# Altium footprint library connectors_socets.pcblib: 601 footprints (part 7 of 38)
Each footprint in its own frame and in the unit in brackets; x right, y up, seen from the top. Pads: shape width x height; smd on the part's side, far side on the other; paste and mask are expansions set on the pad; w line width, h text height; cw(c..) or ccw(c..) is an arc to the next point about the centre after c.
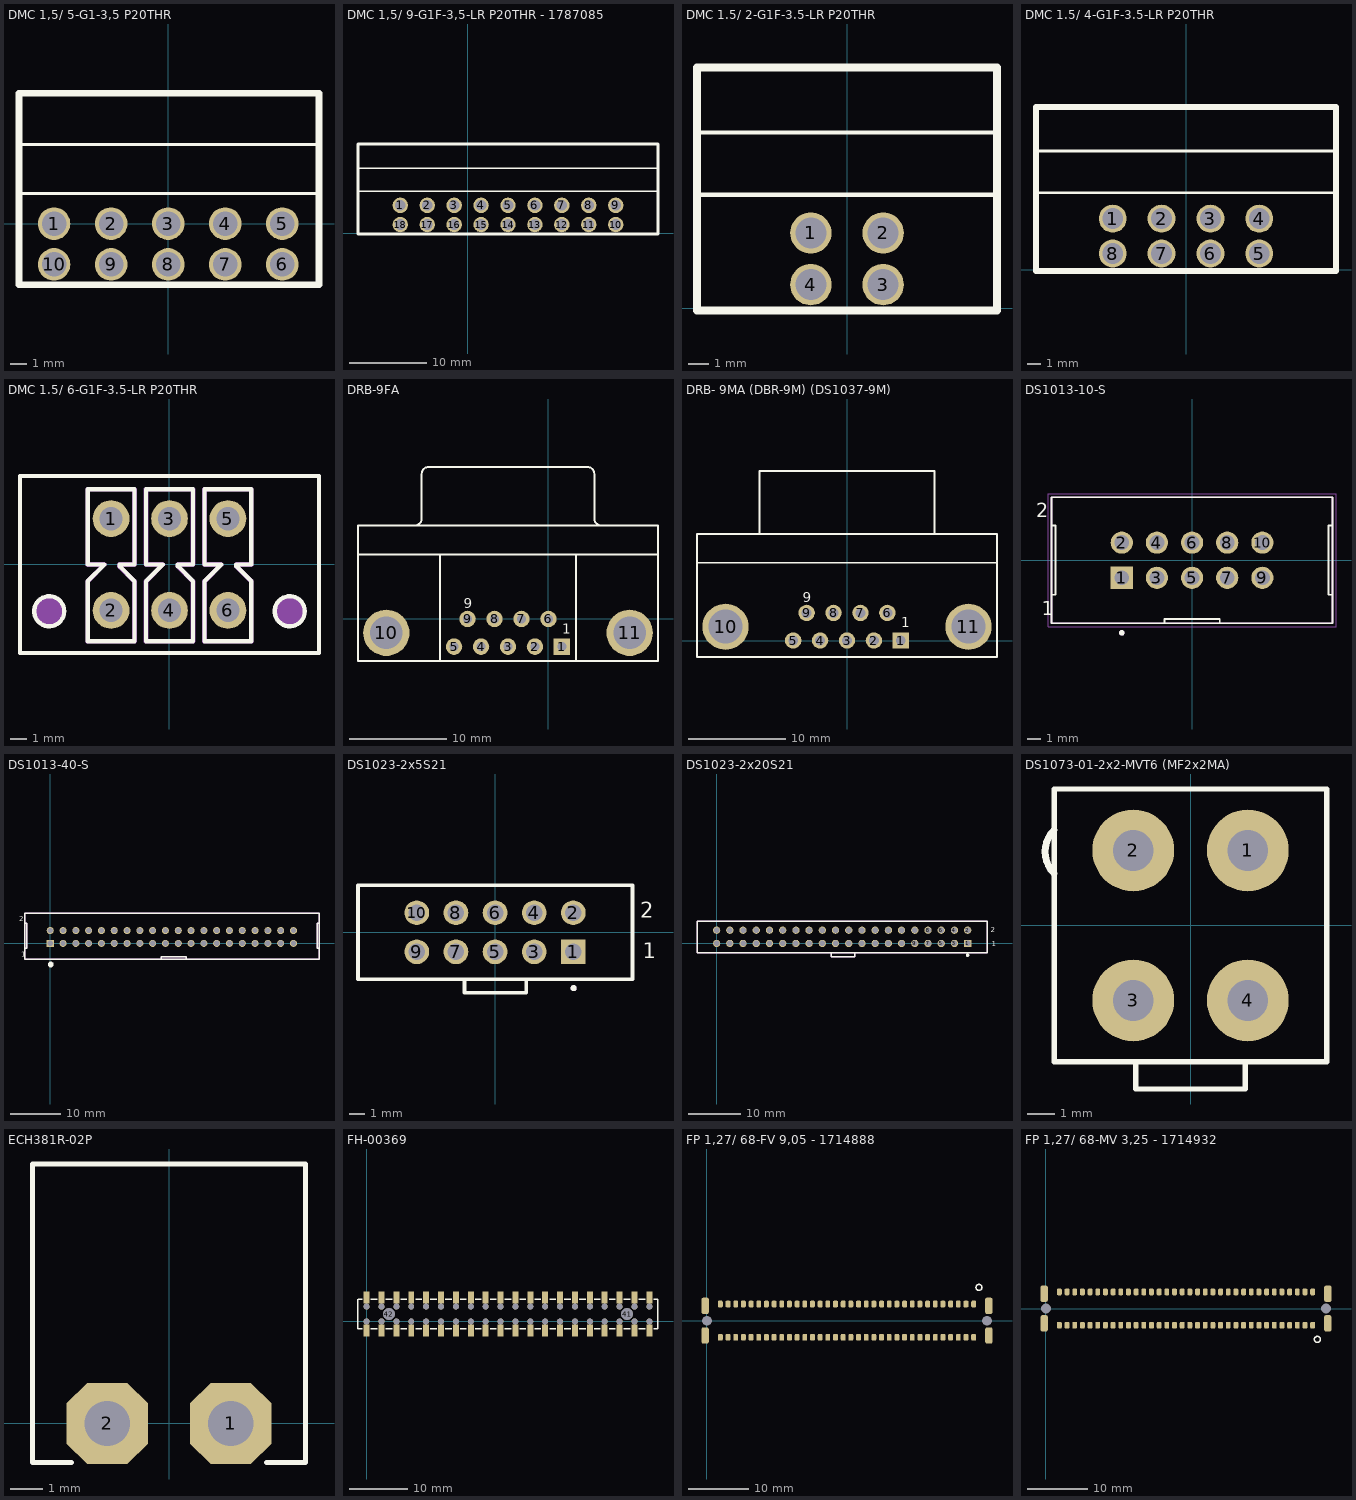
[diagram p6: the footprints below, top view; thin cyan lines are the x and y axes]

## DMC 1,5/ 5-G1-3,5 P20THR [mm] "Connector"
pads (10):
  round 2 hole 1.5: 1(-7,0) 2(-3.5,0) 3(0,0) 4(3.5,0) 5(7,0) 6(7,-2.5) 7(3.5,-2.5) 8(0,-2.5) 9(-3.5,-2.5) 10(-7,-2.5)
Top Overlay:
  lines w0.2: -9.15,1.85 1.75,1.85 9.15,1.85 ; -9.05,4.85 1.75,4.85 9.05,4.85
  lines w0.4: -9.15,-3.75 -9.15,8 9.25,8 9.25,-3.75 -9.15,-3.75
3D body "pxc_1786866_02_01_DMC-1-5-5-G1-3-5-P20THR_3D.stp": height 10.8, standoff -2, extent -9.1,-3.55 9.2,8.05

## DMC 1,5/ 9-G1F-3,5-LR P20THR - 1787085 [mm] "Connector LR"
pads (18):
  round 2 hole 1.4: 1(-8.75,3.65) 2(-5.25,3.65) 3(-1.75,3.65) 4(1.75,3.65) 5(5.25,3.65) 6(8.75,3.65) 7(12.25,3.65) 8(15.75,3.65) 9(19.25,3.65) 10(19.25,1.15) 11(15.75,1.15) 12(12.25,1.15) 13(8.75,1.15) 14(5.25,1.15) 15(1.75,1.15) 16(-1.75,1.15) 17(-5.25,1.15) 18(-8.75,1.15)
Top Overlay:
  lines w0.2: -14.2,5.5 0,5.5 24.75,5.5 ; -14.2,8.5 10.375,8.5 24.65,8.5
  lines w0.4: -14.25,-0.1 -14.25,11.65 24.725,11.65 24.725,-0.1 -14.25,-0.1
3D body "pxc_1787085_02_DMC-1-5-9-G1F-3-5-LR-P20THR_3D.stp": height 10.85, standoff -1.95, extent -14,0.05 24.5,11.65

## DMC 1.5/ 2-G1F-3.5-LR P20THR [mm] "Connector LR"
pads (4):
  round 2 hole 1.5: 1(-1.75,3.65) 2(1.75,3.65) 3(1.75,1.15) 4(-1.75,1.15)
Top Overlay:
  lines w0.2: -7.25,5.5 -4,5.5 7.25,5.5 ; -7.2,8.5 -0.5,8.5 7.25,8.5
  lines w0.4: -7.25,-0.1 7.25,-0.1 7.25,11.65 -7.25,11.65 -7.25,-0.1
3D body "pxc_1787014_02_01_DMC-1-5-2-G1F-3-5-LR-P20THR_3D.stp": height 10.8, standoff -2, extent -7,0 7,11.6

## DMC 1.5/ 4-G1F-3.5-LR P20THR [mm] "Connector LR"
pads (8):
  round 2 hole 1.5: 1(-5.25,3.65) 2(-1.75,3.65) 3(1.75,3.65) 4(5.25,3.65) 5(5.25,1.15) 6(1.75,1.15) 7(-1.75,1.15) 8(-5.25,1.15)
Top Overlay:
  lines w0.2: -10.7,5.5 -4,5.5 10.75,5.5 ; -10.7,8.5 -4,8.5 10.75,8.5
  lines w0.4: -10.75,-0.1 -10.75,11.65 10.75,11.65 10.75,-0.1 -10.75,-0.1
3D body "pxc_1787030_02_02_DMC-1-5-4-G1F-3-5-LR-P20THR_3D.stp": height 10.83, standoff -2, extent -10.5,0 10.5,11.6

## DMC 1.5/ 6-G1F-3.5-LR P20THR [mm] "Connector LR"
pads (6):
  round 2.2 hole 1.4 paste-2539.97 mask+0.05: 1(-3.5,2.75) 3(0,2.75)
  round 2.2 hole 1.4 copper offset 0,0 paste-2539.97 mask+0.05: 2(-3.5,-2.75) 4(0,-2.75) 5(3.5,2.75) 6(3.5,-2.75)
Top Overlay:
  circle w0.254: c-7.2,-2.8 r0.9
  circle w0.254: c7.2,-2.8 r0.9
  lines w0.254: -4.9,4.5 -4.9,0 -3.9,0 -4.9,-1 -4.9,-4.6 -2.099,-4.601 -2.099,-0.999 -3.001,-0.1 -3.001,-0.001 -2.099,-0.001 -2.099,4.5 -2.201,4.5 -4.799,4.5 ; -1.4,4.5 -1.4,0 -0.4,0 -1.4,-1 -1.4,-4.6 1.401,-4.601 1.401,-0.999 0.499,-0.1 0.499,-0.001 1.401,-0.001 1.401,4.5 1.299,4.5 -1.299,4.5 ; 2.1,4.5 2.1,0 3.1,0 2.1,-1 2.1,-4.6 4.901,-4.601 4.901,-0.999 3.999,-0.1 3.999,-0.001 4.901,-0.001 4.901,4.5 4.799,4.5 2.201,4.5 ; -8.95,-5.3 8.95,-5.3 8.95,5.3 -8.95,5.3 -8.95,-5.3
Bot3D:
  drawing of 8 lines, arcs and shapes, not listed
Board3D:
  region: -8.89,5.3 -8.89,5.275 -8.925,5.24 -8.975,5.24 -9.01,5.275 -9.01,5.3 -9.01,5.325 -8.975,5.36 -8.925,5.36 -8.89,5.325
  region: -3.9,3.15 -3.1,3.15 -3.1,2.35 -3.9,2.35
  region: -3.9,-2.35 -3.1,-2.35 -3.1,-3.15 -3.9,-3.15
  region: -0.4,3.15 0.4,3.15 0.4,2.35 -0.4,2.35
  region: -0.4,-2.35 0.4,-2.35 0.4,-3.15 -0.4,-3.15
  region: 3.1,3.15 3.9,3.15 3.9,2.35 3.1,2.35
  region: 3.1,-2.35 3.9,-2.35 3.9,-3.15 3.1,-3.15
  lines w0.051: -8.95,-5.3 -8.95,5.3 8.95,5.3 8.95,-5.3 -8.95,-5.3
3D body "15EDGVHCM-THR-3.5-06P-1Y-1000Z(H)-PA.stp": height 11, standoff -1, extent -8.925,-5.25 8.975,5.35

## DRB-9FA [mm] "D Sub connector 9-pin"
pads (11):
  rect 1.69x1.69 hole 0.9: 1(1.385,-2.84)
  round 1.69 hole 0.9: 2(-1.385,-2.84) 3(-4.155,-2.84) 4(-6.925,-2.84) 5(-9.695,-2.84) 6(0,0) 7(-2.77,0) 8(-5.54,0) 9(-8.31,0)
  round 4.76 hole 3.3: 10(-16.65,-1.42) 11(8.34,-1.42)
Top Overlay:
  lines w0.2: -19.555,6.604 11.245,6.604 ; -13.715,9.609 ccw(c-13.715,10.304) -13.02,10.304 -13.02,14.904 ; -13.015,14.909 cw(c-12.32,14.909) -12.32,15.604 4.01,15.604 cw(c4.01,14.909) 4.705,14.909 ; -11.155,-4.32 -11.155,6.604 ; 2.845,-4.32 2.845,6.604 ; 4.71,14.904 4.71,10.304 ccw(c5.405,10.304) 5.405,9.609 ; -19.555,-4.32 -19.555,9.604 11.245,9.604 11.245,-4.32 -19.555,-4.32
  text "1" at 1.4,-1.5 h1
  text "9" at -8.709,1.095 h1
3D body: height 4, standoff -3, extent -18.067,-1.549 -17.122,-1.095
3D body: height 4, standoff -3, extent -16.299,-1.641 -15.232,-0.912
3D body: height 4, standoff -3, extent 6.914,-1.537 7.981,-0.808
3D body: height 4, standoff -3, extent 8.804,-1.354 9.749,-0.899

## DRB- 9MA (DBR-9M) (DS1037-9M) [mm] "D Sub connector 9-pin"
pads (11):
  rect 1.69x1.69 hole 1: 1(5.54,0)
  round 1.69 hole 1: 2(2.77,0) 3(0,0) 4(-2.77,0) 5(-5.54,0) 6(4.155,2.84) 7(1.385,2.84) 8(-1.385,2.84) 9(-4.155,2.84)
  round 4.76 hole 3.5: 10(-12.495,1.42) 11(12.495,1.42)
Top Overlay:
  lines w0.2: -15.43,8 0,8 15.33,8 ; -9,10.94 -9,17.44 0.1,17.44 ; 0,17.44 9,17.44 9,10.94 ; -15.43,-1.67 -15.43,0 -15.43,10.94 15.43,10.94 15.43,0 15.43,-1.67 15.4,-1.7 -15.4,-1.7 -15.43,-1.67
  text "1" at 5.555,1.34 h1
  text "9" at -4.554,3.935 h1
3D body "DRB-9M.stp": height 3.5, standoff -12.9, extent -15.25,-0.775 15.25,17.149

## DS1013-10-S [mm]
pads (10):
  rect 1.605x1.605 hole 1.07: 1(-5.08,-1.27)
  round 1.605 hole 1.07: 2(-5.08,1.27) 3(-2.54,-1.27) 4(-2.54,1.27) 5(0,-1.27) 6(0,1.27) 7(2.54,-1.27) 8(2.54,1.27) 9(5.08,-1.27) 10(5.08,1.27)
Top Overlay:
  circle w0.2: c-5.08,-5.25 r0.1
  lines w0.127: -10.15,-2.5 -9.866,-2.5 -9.866,2.5 -10.15,2.5 ; -2,-4.55 -2,-4.25 2,-4.25 2,-4.55 ; 10.15,-2.5 10,-2.5 9.866,-2.5 9.866,2.5 10.15,2.5 ; -10.15,-4.55 10.15,-4.55 10.15,4.55 -10.15,4.55 -10.15,-4.55
  text "1" at -10.878,-3.968 h1
  text "2" at -11.278,3.107 h1
Plata3D:
  circle w0.2: c-5.08,-5.25 r0.1
  lines w0.127: -10.15,-4.55 10.15,-4.55 10.15,4.55 -10.15,4.55 -10.15,-4.55
Board3D:
  lines w0.05: -10.4,-4.8 -10.4,4.8 10.4,4.8 10.4,-4.8 -10.4,-4.8
3D body "DS1013-10SSIB1--3DModel-STEP-510211.STEP": height 9.1, standoff -3.1, extent -10.15,-4.4 10.15,4.7

## DS1013-40-S [mm]
pads (40):
  rect 1.4x1.4 hole 1.05: 1(0,0)
  round 1.4 hole 1.05: 2(0,2.54) 3(2.54,0) 4(2.54,2.54) 5(5.08,0) 6(5.08,2.54) 7(7.62,0) 8(7.62,2.54) 9(10.16,0) 10(10.16,2.54) 11(12.7,0) 12(12.7,2.54) 13(15.24,0) 14(15.24,2.54) 15(17.78,0) 16(17.78,2.54) 17(20.32,0) 18(20.32,2.54) 19(22.86,0) 20(22.86,2.54) 21(25.4,0) 22(25.4,2.54) 23(27.94,0) 24(27.94,2.54) 25(30.48,0) 26(30.48,2.54) 27(33.02,0) 28(33.02,2.54) 29(35.56,0) 30(35.56,2.54) 31(38.1,0) 32(38.1,2.54) 33(40.64,0) 34(40.64,2.54) 35(43.18,0) 36(43.18,2.54) 37(45.72,0) 38(45.72,2.54) 39(48.26,0) 40(48.26,2.54)
Top Overlay:
  circle w1: c0.125,-4.175 r0.071
  lines w0.254: -5.075,-1 -4.65,-1 -4.65,4 -5,4 ; 22,-3 22,-2.7 27,-2.7 27,-3.125 ; 53.325,-1 52.95,-1 52.95,4 53.325,4 ; -5.075,-3.125 53.325,-3.125 53.325,5.975 -5.075,5.975 -5.075,5.675 -5.075,-3.125
  text "1" at -5.798,-2.698 h1
  text "2" at -6.198,4.377 h1
Plata3D:
  lines w0.254: -5.075,-1 -4.65,-1 -4.65,4 -5,4 ; 22,-3 22,-2.7 27,-2.7 27,-3.125 ; 53.325,-1 52.95,-1 52.95,4 53.325,4 ; -5.075,-3.125 -5.075,5.675 -5.075,5.975 53.325,5.975 53.325,-3.125 -5.075,-3.125
3D body "DS1013-40SSIB1-B-0--3DModel-STEP-510211.STEP": height 9.11, standoff -3.09, extent -5.075,-3.125 53.325,5.975

## DS1023-2x5S21 [mm]
pads (10):
  rect 1.605x1.605 hole 1.07: 1(5.08,-1.27)
  round 1.605 hole 1.07: 2(5.08,1.27) 3(2.54,-1.27) 4(2.54,1.27) 5(0,-1.27) 6(0,1.27) 7(-2.54,-1.27) 8(-2.54,1.27) 9(-5.08,-1.27) 10(-5.08,1.27)
Top Overlay:
  circle w0.2: c5.1,-3.625 r0.1
  lines w0.254: -1.975,-3.05 -1.975,-3.925 2.025,-3.925 2.025,-3.05 ; -8.9,-3.05 8.925,-3.05 8.925,3.05 -8.9,3.05 -8.9,-3.05
  text "2" at 9.427,0.952 h1
  text "1" at 9.577,-1.698 h1
Plata3D:
  circle w0.2: c5.1,-3.625 r0.1
3D body "DS1023-2x5S21.stp": height 10.01, standoff -3.14, extent -8.85,-4 8.85,3

## DS1023-2x20S21 [mm]
pads (40):
  rect 1.4x1.4 hole 1.05: 1(48.26,0)
  round 1.4 hole 1.05: 2(48.26,2.54) 3(45.72,0) 4(45.72,2.54) 5(43.18,0) 6(43.18,2.54) 7(40.64,0) 8(40.64,2.54) 9(38.1,0) 10(38.1,2.54) 11(35.56,0) 12(35.56,2.54) 13(33.02,0) 14(33.02,2.54) 15(30.48,0) 16(30.48,2.54) 17(27.94,0) 18(27.94,2.54) 19(25.4,0) 20(25.4,2.54) 21(22.86,0) 22(22.86,2.54) 23(20.32,0) 24(20.32,2.54) 25(17.78,0) 26(17.78,2.54) 27(15.24,0) 28(15.24,2.54) 29(12.7,0) 30(12.7,2.54) 31(10.16,0) 32(10.16,2.54) 33(7.62,0) 34(7.62,2.54) 35(5.08,0) 36(5.08,2.54) 37(2.54,0) 38(2.54,2.54) 39(0,0) 40(0,2.54)
Top Overlay:
  circle w0.5: c48.26,-2.275 r0.071
  lines w0.254: 22,-1.85 22,-2.6 26.55,-2.6 26.55,-1.85 ; -3.775,-1.75 52.025,-1.75 52.025,4.3 -3.775,4.3 -3.775,-1.75
  text "1" at 52.902,-0.498 h1
  text "2" at 52.677,2.127 h1
Board:
  lines w0.254: -3.775,-1.75 52.025,-1.75 52.025,4.3 -3.775,4.3 -3.775,-1.75
Plata3D:
  lines w0.254: 22,-1.85 22,-2.6 26.55,-2.6 26.55,-1.85
3D body "DS1023-2x20S21.stp": height 10.01, standoff -3.14, extent -3.775,-2.7 52.025,4.3

## DS1073-01-2x2-MVT6 (MF2x2MA) [mm] "Power Connector"
pads (4):
  round 3 hole 1.5: 1(2.1,2.75) 2(-2.1,2.75) 3(-2.1,-2.75) 4(2.1,-2.75)
Top Overlay:
  lines w0.2: -2,-5 -2,-6 2,-6 2,-5 ; -5,-5 0,-5 5,-5 5,0 5,5 0,5 -5,5 -5,0 -5,-5
  lines w0.254: -5,1.9 cw(c-4.2,2.7) -5,3.5
3D body "User Library-Con_MF-xxMA.step": height 12.8, standoff -3.5, extent -5.2,-6.2 4.8,4.8

## ECH381R-02P [mm] "Connector 3.81 pitch"
pads (2):
  oct 2.5x2.5 hole 1.4: 1(1.905,0) 2(-1.905,0)
Top Overlay:
  lines w0.15: -3,-1.2 -4.205,-1.2 -4.205,8 4.205,8 4.205,-1.2 3,-1.2
3D body "001.stp": height 7.2, standoff -3.4, extent -4.21,-1.2 4.2,8

## FH-00369 [mm] "Connector; 10x2"
pads (82):
  round 1.02 hole 1.02 unplated: 1(0,0) 2(0,2.54) 3(2.54,0) 4(2.54,2.54) 5(5.08,0) 6(5.08,2.54) 7(7.62,0) 8(7.62,2.54) 9(10.16,0) 10(10.16,2.54) 11(12.7,0) 12(12.7,2.54) 13(15.24,0) 14(15.24,2.54) 15(17.78,0) 16(17.78,2.54) 17(20.32,0) 18(20.32,2.54) 19(22.86,0) 20(22.86,2.54) 21(25.4,0) 22(25.4,2.54) 23(27.94,0) 24(27.94,2.54) 25(30.48,0) 26(30.48,2.54) 27(33.02,0) 28(33.02,2.54) 29(35.56,0) 30(35.56,2.54) 31(38.1,0) 32(38.1,2.54) 33(40.64,0) 34(40.64,2.54) 35(43.18,0) 36(43.18,2.54) 37(45.72,0) 38(45.72,2.54) 39(48.26,0) 40(48.26,2.54)
  rect 1.02x2 smd: 1(0,-1.53) 2(0,4.07) 3(2.54,-1.53) 4(2.54,4.07) 5(5.08,-1.53) 6(5.08,4.07) 7(7.62,-1.53) 8(7.62,4.07) 9(10.16,-1.53) 10(10.16,4.07) 11(12.7,-1.53) 12(12.7,4.07) 13(15.24,-1.53) 14(15.24,4.07) 15(17.78,-1.53) 16(17.78,4.07) 17(20.32,-1.53) 18(20.32,4.07) 19(22.86,-1.53) 20(22.86,4.07) 21(25.4,-1.53) 22(25.4,4.07) 23(27.94,-1.53) 24(27.94,4.07) 25(30.48,-1.53) 26(30.48,4.07) 27(33.02,-1.53) 28(33.02,4.07) 29(35.56,-1.53) 30(35.56,4.07) 31(38.1,-1.53) 32(38.1,4.07) 33(40.64,-1.53) 34(40.64,4.07) 35(43.18,-1.53) 36(43.18,4.07) 37(45.72,-1.53) 38(45.72,4.07) 39(48.26,-1.53) 40(48.26,4.07)
  round 2 hole 2 unplated: 41(44.45,1.27) 42(3.81,1.27)
Top Overlay:
  lines w0.254: -0.741,-1.27 -1.47,-1.27 -1.47,3.81 -0.741,3.81 ; 0.741,-1.27 1.799,-1.27 ; 0.741,3.81 1.799,3.81 ; 3.281,-1.27 4.339,-1.27 ; 3.281,3.81 4.339,3.81 ; 5.821,-1.27 6.879,-1.27 ; 5.821,3.81 6.879,3.81 ; 8.361,-1.27 9.419,-1.27 ; 8.361,3.81 9.419,3.81 ; 10.901,-1.27 11.959,-1.27 ; 10.901,3.81 11.959,3.81 ; 13.441,-1.27 14.499,-1.27 ; 13.441,3.81 14.499,3.81 ; 15.981,-1.27 17.039,-1.27 ; 15.981,3.81 17.039,3.81 ; 18.521,-1.27 19.579,-1.27 ; 18.521,3.81 19.579,3.81 ; 21.061,-1.27 22.119,-1.27 ; 21.061,3.81 22.119,3.81 ; 23.601,-1.27 24.659,-1.27 ; 23.601,3.81 24.659,3.81 ; 26.141,-1.27 27.199,-1.27 ; 26.141,3.81 27.199,3.81 ; 28.681,-1.27 29.739,-1.27 ; 28.681,3.81 29.739,3.81 ; 31.221,-1.27 32.279,-1.27 ; 31.221,3.81 32.279,3.81 ; 33.761,-1.27 34.819,-1.27 ; 33.761,3.81 34.819,3.81 ; 36.301,-1.27 37.359,-1.27 ; 36.301,3.81 37.359,3.81 ; 38.841,-1.27 39.899,-1.27 ; 38.841,3.81 39.899,3.81 ; 41.381,-1.27 42.439,-1.27 ; 41.381,3.81 42.439,3.81 ; 43.921,-1.27 44.979,-1.27 ; 43.921,3.81 44.979,3.81 ; 46.461,-1.27 47.519,-1.27 ; 46.461,3.81 47.519,3.81 ; 49.001,-1.27 49.73,-1.27 49.73,3.81 49.001,3.81
3D body "FH-00369.stp": height 3.9, standoff -1, extent -1.397,-2.03 49.804,4.57

## FP 1,27/ 68-FV 9,05 - 1714888 [mm]
pads (74):
  rrect50% 0.8x1.1 smd mask+0.05: 1(44.12,2.75) 2(42.85,2.75) 3(41.58,2.75) 4(40.31,2.75) 5(39.04,2.75) 6(37.77,2.75) 7(36.5,2.75) 8(35.23,2.75) 9(33.96,2.75) 10(32.69,2.75) 11(31.42,2.75) 12(30.15,2.75) 13(28.88,2.75) 14(27.61,2.75) 15(26.34,2.75) 16(25.07,2.75) 17(23.8,2.75) 18(22.53,2.75) 19(21.26,2.75) 20(19.99,2.75) 21(18.72,2.75) 22(17.45,2.75) 23(16.18,2.75) 24(14.91,2.75) 25(13.64,2.75) 26(12.37,2.75) 27(11.1,2.75) 28(9.83,2.75) 29(8.56,2.75) 30(7.29,2.75) 31(6.02,2.75) 32(4.75,2.75) 33(3.48,2.75) 34(2.21,2.75) 35(2.21,-2.75) 36(3.48,-2.75) 37(4.75,-2.75) 38(6.02,-2.75) 39(7.29,-2.75) 40(8.56,-2.75) 41(9.83,-2.75) 42(11.1,-2.75) 43(12.37,-2.75) 44(13.64,-2.75) 45(14.91,-2.75) 46(16.18,-2.75) 47(17.45,-2.75) 48(18.72,-2.75) 49(19.99,-2.75) 50(21.26,-2.75) 51(22.53,-2.75) 52(23.8,-2.75) 53(25.07,-2.75) 54(26.34,-2.75) 55(27.61,-2.75) 56(28.88,-2.75) 57(30.15,-2.75) 58(31.42,-2.75) 59(32.69,-2.75) 60(33.96,-2.75) 61(35.23,-2.75) 62(36.5,-2.75) 63(37.77,-2.75) 64(39.04,-2.75) 65(40.31,-2.75) 66(41.58,-2.75) 67(42.85,-2.75) 68(44.12,-2.75)
  rrect50% 1.2x2.7 smd mask+0.05: MNT(-0.3,-2.45) MNT(-0.3,2.45) MNT(46.63,2.45) MNT(46.63,-2.45)
  round 0 hole 1.6 unplated: MNT(0,0) MNT(46.33,0)
Top Overlay:
  circle w0.254: c45,5.5 r0.5
3D body "pxc_1714888_00_FP-1-27-68-FV-9-05_3D.stp": height 9.05, standoff -0.7, extent -0.975,-3.6 47.295,3.6

## FP 1,27/ 68-MV 3,25 - 1714932 [mm]
pads (74):
  rrect50% 0.8x1.1 smd mask+0.05: 1(44.12,-2.75) 2(42.85,-2.75) 3(41.58,-2.75) 4(40.31,-2.75) 5(39.04,-2.75) 6(37.77,-2.75) 7(36.5,-2.75) 8(35.23,-2.75) 9(33.96,-2.75) 10(32.69,-2.75) 11(31.42,-2.75) 12(30.15,-2.75) 13(28.88,-2.75) 14(27.61,-2.75) 15(26.34,-2.75) 16(25.07,-2.75) 17(23.8,-2.75) 18(22.53,-2.75) 19(21.26,-2.75) 20(19.99,-2.75) 21(18.72,-2.75) 22(17.45,-2.75) 23(16.18,-2.75) 24(14.91,-2.75) 25(13.64,-2.75) 26(12.37,-2.75) 27(11.1,-2.75) 28(9.83,-2.75) 29(8.56,-2.75) 30(7.29,-2.75) 31(6.02,-2.75) 32(4.75,-2.75) 33(3.48,-2.75) 34(2.21,-2.75) 35(2.21,2.75) 36(3.48,2.75) 37(4.75,2.75) 38(6.02,2.75) 39(7.29,2.75) 40(8.56,2.75) 41(9.83,2.75) 42(11.1,2.75) 43(12.37,2.75) 44(13.64,2.75) 45(14.91,2.75) 46(16.18,2.75) 47(17.45,2.75) 48(18.72,2.75) 49(19.99,2.75) 50(21.26,2.75) 51(22.53,2.75) 52(23.8,2.75) 53(25.07,2.75) 54(26.34,2.75) 55(27.61,2.75) 56(28.88,2.75) 57(30.15,2.75) 58(31.42,2.75) 59(32.69,2.75) 60(33.96,2.75) 61(35.23,2.75) 62(36.5,2.75) 63(37.77,2.75) 64(39.04,2.75) 65(40.31,2.75) 66(41.58,2.75) 67(42.85,2.75) 68(44.12,2.75)
  rrect50% 1.2x2.7 smd mask+0.05: MNT(-0.3,-2.45) MNT(-0.3,2.45) MNT(46.63,2.45) MNT(46.63,-2.45)
  round 0 hole 1.6 unplated: MNT(0,0) MNT(46.33,0)
Top Overlay:
  circle w0.254: c44.9,-5.1 r0.5
3D body "pxc_1714932_01_FP-1-27-68-MV-3-25_3D.stp": height 8.25, standoff -0.7, extent -0.965,-3.6 47.305,3.6